# Altium schematic symbol library FPGA_Xilinx_Virtex7.SchLib: 34 symbols (part 19 of 34) (continued)
## XC7VX485T-FFG1927 (continued)
part O pins: AC22 VREFN_0 (io), AC23 VP_0 (io), AD22 VN_0 (io), AD23 VREFP_0 (io), AE10 PROGRAM_B_0 (io), AE11 DONE_0 (io), AE12 VCCO_0 (power), AE22 DXN_0 (io), AE23 DXP_0 (io), AE34 CCLK_0 (io), AF10 M2_0 (io), AF34 TMS_0 (io), AF35 TCK_0 (io), AG10 M1_0 (io), AG11 M0_0 (io), AG12 VCCO_0 (power), AG34 TDO_0 (io), AG35 TDI_0 (io), AK11 CFGBVS_0 (io), AK34 INIT_B_0 (io)
part P pins: A3 GND (power), A4 GND (power), A7 GND (power), A8 GND (power), A11 GND (power), A12 GND (power), A22 GND (power), A32 GND (power), A34 GND (power), A37 GND (power), A38 GND (power), A41 GND (power), A42 GND (power), AA13 VCCINT (power), AA15 VCCINT (power), AA17 VCCINT (power), AA19 VCCAUX_IO_G3 (power), AA21 VCCINT (power), AA23 VCCINT (power), AA25 VCCBRAM (power), AA27 VCCAUX (power), AA29 VCCINT (power), AA31 VCCINT (power), AA33 VCCINT (power), AB12 VCCINT (power), AB14 VCCINT (power), AB16 VCCINT (power), AB18 VCCAUX (power), AB20 VCCINT (power), AB22 GNDADC_0 (power), AB23 VCCADC_0 (power), AB24 VCCBRAM (power), AB26 VCCAUX_IO_G1 (power), AB28 VCCINT (power), AB30 VCCINT (power), AB32 VCCINT (power), AC13 VCCINT (power), AC15 VCCINT (power), AC17 VCCINT (power), AC19 VCCAUX_IO_G3 (power), AC21 VCCINT (power), AC25 VCCBRAM (power), AC27 VCCAUX (power), AC29 VCCINT (power), AC31 VCCINT (power), AC33 VCCINT (power), AD12 VCCINT (power), AD14 VCCINT (power), AD16 VCCINT (power), AD18 VCCAUX (power), AD20 VCCINT (power), AD24 VCCBRAM (power), AD26 VCCAUX_IO_G0 (power), AD28 VCCINT (power), AD30 VCCINT (power), AD32 VCCINT (power), AE13 VCCINT (power), AE15 VCCINT (power), AE17 VCCINT (power), AE19 VCCAUX_IO_G2 (power), AE21 VCCINT (power), AE25 VCCBRAM (power), AE27 VCCAUX (power), AE29 VCCINT (power), AE31 VCCINT (power), AE33 VCCINT (power), AE35 VCCBATT_0 (power), AF12 VCCINT (power), AF14 VCCINT (power), AF16 VCCINT (power), AF18 VCCAUX (power), AF20 VCCINT (power), AF22 VCCINT (power), AF24 VCCBRAM (power), AF26 VCCAUX_IO_G0 (power), AF28 VCCINT (power), AF30 VCCINT (power), AF32 VCCINT (power), AG13 VCCINT (power), AG15 VCCINT (power), AG17 VCCINT (power), AG19 VCCAUX_IO_G2 (power), AG21 VCCINT (power), AG23 VCCINT (power), AG25 VCCBRAM (power), AG27 VCCAUX (power), AG29 VCCINT (power), AG31 VCCINT (power), AG33 VCCINT (power), AH12 VCCINT (power), AH14 VCCINT (power), AH16 VCCINT (power), AH18 VCCAUX (power), AH20 VCCINT (power), AH22 VCCINT (power), AH24 VCCBRAM (power), AH26 VCCAUX_IO_G0 (power), AH28 VCCINT (power), AH30 VCCINT (power), AH32 VCCINT (power), AJ15 VCCINT (power), AJ17 VCCINT (power), AJ19 VCCAUX_IO_G2 (power), AJ27 VCCAUX (power), AJ33 VCCINT (power), B2 GND (power), B6 GND (power), B9 GND (power), B11 GND (power), B19 GND (power), B29 GND (power), B34 GND (power), B36 GND (power), B39 GND (power), B43 GND (power), C4 GND (power), C7 GND (power), C8 GND (power), C11 GND (power), C16 GND (power), C26 GND (power), C34 GND (power), C37 GND (power), C38 GND (power), C41 GND (power), D1 GND (power), D2 GND (power), D6 GND (power), D9 GND (power), D11 GND (power), D13 GND (power), D23 GND (power), D33 GND (power), D34 GND (power), D36 GND (power), D39 GND (power), D43 GND (power), D44 GND (power), E3 GND (power), E4 GND (power), E7 GND (power), E8 GND (power), E11 GND (power), E20 GND (power), E30 GND (power), E34 GND (power), E37 GND (power), E38 GND (power), E41 GND (power), E42 GND (power), F1 GND (power), F2 GND (power), F6 GND (power), F9 GND (power), F11 GND (power), F17 GND (power), F27 GND (power), F34 GND (power), F36 GND (power), F39 GND (power), F43 GND (power), F44 GND (power), G4 GND (power), G7 GND (power), G8 GND (power), G11 GND (power), G14 GND (power), G24 GND (power), G34 GND (power), G37 GND (power), G38 GND (power), G41 GND (power), H1 GND (power), H2 GND (power), H6 GND (power), H9 GND (power), H11 GND (power), H21 GND (power), H31 GND (power), H34 GND (power), H36 GND (power), H39 GND (power), H43 GND (power), H44 GND (power), J3 GND (power), J4 GND (power), J7 GND (power), J8 GND (power), J11 GND (power), J18 GND (power), J28 GND (power), J34 GND (power), V12 VCCINT (power), V14 VCCINT (power), V18 VCCAUX (power), V20 VCCINT (power), V22 VCCINT (power), V24 VCCBRAM (power), V26 VCCAUX_IO_G1 (power), V28 VCCINT (power), V30 VCCINT (power), V32 VCCINT (power), W13 VCCINT (power), W15 VCCINT (power), W17 VCCINT (power), W19 VCCAUX_IO_G3 (power), W21 VCCINT (power), W23 VCCINT (power), W25 VCCBRAM (power), W27 VCCAUX (power), W29 VCCINT (power), W31 VCCINT (power), W33 VCCINT (power), Y12 VCCINT (power), Y14 VCCINT (power), Y16 VCCINT (power), Y18 VCCAUX (power), Y20 VCCINT (power), Y22 VCCINT (power), Y24 VCCBRAM (power), Y26 VCCAUX_IO_G1 (power), Y28 VCCINT (power), Y30 VCCINT (power), Y32 VCCINT (power)
part Q pins: AA3 GND (power), AA4 GND (power), AA7 GND (power), AA11 GND (power), AA12 GND (power), AA14 GND (power), AA16 GND (power), AA18 GND (power), AA20 GND (power), AA22 GND (power), AA24 GND (power), AA26 GND (power), AA28 GND (power), AA30 GND (power), AA32 GND (power), AA34 GND (power), AA38 GND (power), AA41 GND (power), AA42 GND (power), AB1 GND (power), AB2 GND (power), AB6 GND (power), AB9 GND (power), AB10 GND (power), AB11 GND (power), AB13 GND (power), AB15 GND (power), AB17 GND (power), AB19 GND (power), AB21 GND (power), AB25 GND (power), AB27 GND (power), AB29 GND (power), AB31 GND (power), AB33 GND (power), AB34 GND (power), AB35 GND (power), AB36 GND (power), AB39 GND (power), AB43 GND (power), AB44 GND (power), AC4 GND (power), AC8 GND (power), AC11 GND (power), AC12 GND (power), AC14 GND (power), AC16 GND (power), AC18 GND (power), AC20 GND (power), AC24 GND (power), AC26 GND (power), AC28 GND (power), AC30 GND (power), AC32 GND (power), AC34 GND (power), AC37 GND (power), AC41 GND (power), AD1 GND (power), AD2 GND (power), AD6 GND (power), AD9 GND (power), AD10 GND (power), AD11 GND (power), AD13 GND (power), AD15 GND (power), AD17 GND (power), AD19 GND (power), AD21 GND (power), AD25 GND (power), AD27 GND (power), AD29 GND (power), AD31 GND (power), AD33 GND (power), AD34 GND (power), AD35 GND (power), AD36 GND (power), AD39 GND (power), AD43 GND (power), AD44 GND (power), AE3 GND (power), AE4 GND (power), AE7 GND (power), AE9 GND (power), AE14 GND (power), AE16 GND (power), AE18 GND (power), AE20 GND (power), AE24 GND (power), AE26 GND (power), AE28 GND (power), AE30 GND (power), AE32 GND (power), AE36 GND (power), AE38 GND (power), AE41 GND (power), AE42 GND (power), AF1 GND (power), AF2 GND (power), AF6 GND (power), AF9 GND (power), AF11 GND (power), AF13 GND (power), AF15 GND (power), AF17 GND (power), AF19 GND (power), AF21 GND (power), AF23 GND (power), AF25 GND (power), AF27 GND (power), AF29 GND (power), AF31 GND (power), AF33 GND (power), AF36 GND (power), AF39 GND (power), AF43 GND (power), AF44 GND (power), AG4 GND (power), AG7 GND (power), AG9 GND (power), AG14 GND (power), AG16 GND (power), AG18 GND (power), AG20 GND (power), AG22 GND (power), AG24 GND (power), AG26 GND (power), AG28 GND (power), AG30 GND (power), AG32 GND (power), AG36 GND (power), AG38 GND (power), AG41 GND (power), AH1 GND (power), AH2 GND (power), AH6 GND (power), AH9 GND (power), AH10 GND (power), AH11 GND (power), AH13 GND (power), AH15 GND (power), AH17 GND (power), AH19 GND (power), AH21 GND (power), AH23 GND (power), AH25 GND (power), AH27 GND (power), AH29 GND (power), AH31 GND (power), AH33 GND (power), AH34 GND (power), J37 GND (power), J38 GND (power), J41 GND (power), J42 GND (power), K1 GND (power), K2 GND (power), K6 GND (power), K9 GND (power), K11 GND (power), K15 GND (power), K25 GND (power), K34 GND (power), K36 GND (power), K39 GND (power), K43 GND (power), K44 GND (power), L4 GND (power), L7 GND (power), L8 GND (power), L11 GND (power), L12 GND (power), L22 GND (power), L32 GND (power), L34 GND (power), L37 GND (power), L38 GND (power), L41 GND (power), M1 GND (power), M2 GND (power), M6 GND (power), M9 GND (power), M11 GND (power), M19 GND (power), M29 GND (power), M34 GND (power), M36 GND (power), M39 GND (power), M43 GND (power), M44 GND (power), N3 GND (power), N4 GND (power), N7 GND (power), N8 GND (power), N11 GND (power), N16 GND (power), N26 GND (power), N34 GND (power), N37 GND (power), N38 GND (power), N41 GND (power), N42 GND (power), P1 GND (power), P2 GND (power), P6 GND (power), P9 GND (power), P11 GND (power), P13 GND (power), P23 GND (power), P33 GND (power), P34 GND (power), P36 GND (power), P39 GND (power), P43 GND (power), P44 GND (power), R4 GND (power), R7 GND (power), R11 GND (power), R20 GND (power), R30 GND (power), R34 GND (power), R38 GND (power), R41 GND (power), T1 GND (power), T2 GND (power), T6 GND (power), T9 GND (power), T11 GND (power), T17 GND (power), T27 GND (power), T34 GND (power), T36 GND (power), T39 GND (power), T43 GND (power), T44 GND (power), U3 GND (power), U4 GND (power), U7 GND (power), U11 GND (power), U14 GND (power), U24 GND (power), U34 GND (power), U38 GND (power), U41 GND (power), U42 GND (power), V1 GND (power), V2 GND (power), V6 GND (power), V9 GND (power), V11 GND (power), V13 GND (power), V17 GND (power), V19 GND (power), V21 GND (power), V23 GND (power), V25 GND (power), V27 GND (power), V29 GND (power), V31 GND (power), V33 GND (power), V34 GND (power), V36 GND (power), V39 GND (power), V43 GND (power), V44 GND (power), W4 GND (power), W7 GND (power), W11 GND (power), W12 GND (power), W14 GND (power), W16 GND (power), W18 GND (power), W20 GND (power), W22 GND (power), W24 GND (power), W26 GND (power), W28 GND (power), W30 GND (power), W32 GND (power), W34 GND (power), W38 GND (power), W41 GND (power), Y1 GND (power), Y2 GND (power), Y6 GND (power), Y9 GND (power), Y11 GND (power), Y13 GND (power), Y15 GND (power), Y17 GND (power), Y19 GND (power), Y21 GND (power), Y23 GND (power), Y25 GND (power), Y27 GND (power), Y29 GND (power), Y31 GND (power), Y33 GND (power), Y34 GND (power), Y36 GND (power), Y39 GND (power), Y43 GND (power), Y44 GND (power)
part R pins: AH35 GND (power), AH36 GND (power), AH39 GND (power), AH43 GND (power), AH44 GND (power), AJ4 GND (power), AJ8 GND (power), AJ11 GND (power), AJ12 GND (power), AJ18 GND (power), AJ20 GND (power), AJ24 GND (power), AJ28 GND (power), AJ34 GND (power), AJ37 GND (power), AJ41 GND (power), AK1 GND (power), AK2 GND (power), AK5 GND (power), AK6 GND (power), AK9 GND (power), AK10 GND (power), AK15 GND (power), AK25 GND (power), AK35 GND (power), AK36 GND (power), AK39 GND (power), AK40 GND (power), AK43 GND (power), AK44 GND (power), AL4 GND (power), AL7 GND (power), AL11 GND (power), AL12 GND (power), AL22 GND (power), AL32 GND (power), AL34 GND (power), AL38 GND (power), AL41 GND (power), AM1 GND (power), AM2 GND (power), AM6 GND (power), AM9 GND (power), AM11 GND (power), AM19 GND (power), AM29 GND (power), AM34 GND (power), AM36 GND (power), AM39 GND (power), AM43 GND (power), AM44 GND (power), AN3 GND (power), AN4 GND (power), AN7 GND (power), AN11 GND (power), AN16 GND (power), AN26 GND (power), AN34 GND (power), AN38 GND (power), AN41 GND (power), AN42 GND (power), AP1 GND (power), AP2 GND (power), AP6 GND (power), AP9 GND (power), AP11 GND (power), AP13 GND (power), AP23 GND (power), AP33 GND (power), AP34 GND (power), AP36 GND (power), AP39 GND (power), AP43 GND (power), AP44 GND (power), AR4 GND (power), AR7 GND (power), AR11 GND (power), AR20 GND (power), AR30 GND (power), AR34 GND (power), AR38 GND (power), AR41 GND (power), AT1 GND (power), AT2 GND (power), AT6 GND (power), AT9 GND (power), AT10 GND (power), AT11 GND (power), AT17 GND (power), AT27 GND (power), AT34 GND (power), AT35 GND (power), AT36 GND (power), AT39 GND (power), AT43 GND (power), AT44 GND (power), AU3 GND (power), AU4 GND (power), AU7 GND (power), AU9 GND (power), AU14 GND (power), AU24 GND (power), AU34 GND (power), AU36 GND (power), AU38 GND (power), AU41 GND (power), AU42 GND (power), AV1 GND (power), AV2 GND (power), AV6 GND (power), AV9 GND (power), AV11 GND (power), AV21 GND (power), AV31 GND (power), AV36 GND (power), AV39 GND (power), AV43 GND (power), AV44 GND (power), AW4 GND (power), AW7 GND (power), AW9 GND (power), AW18 GND (power), AW28 GND (power), AW36 GND (power), AW38 GND (power), AW41 GND (power), AY1 GND (power), AY2 GND (power), AY6 GND (power), AY9 GND (power), AY15 GND (power), AY25 GND (power), AY35 GND (power), AY36 GND (power), AY39 GND (power), AY43 GND (power), AY44 GND (power), BA3 GND (power), BA4 GND (power), BA7 GND (power), BA9 GND (power), BA12 GND (power), BA22 GND (power), BA32 GND (power), BA36 GND (power), BA38 GND (power), BA41 GND (power), BA42 GND (power), BB1 GND (power), BB2 GND (power), BB6 GND (power), BB9 GND (power), BB19 GND (power), BB29 GND (power), BB36 GND (power), BB39 GND (power), BB43 GND (power), BB44 GND (power), BC2 GND (power), BC4 GND (power), BC7 GND (power), BC9 GND (power), BC16 GND (power), BC26 GND (power), BC36 GND (power), BC38 GND (power), BC41 GND (power), BC43 GND (power), BD5 GND (power), BD6 GND (power), BD9 GND (power), BD13 GND (power), BD23 GND (power), BD33 GND (power), BD36 GND (power), BD39 GND (power), BD40 GND (power)

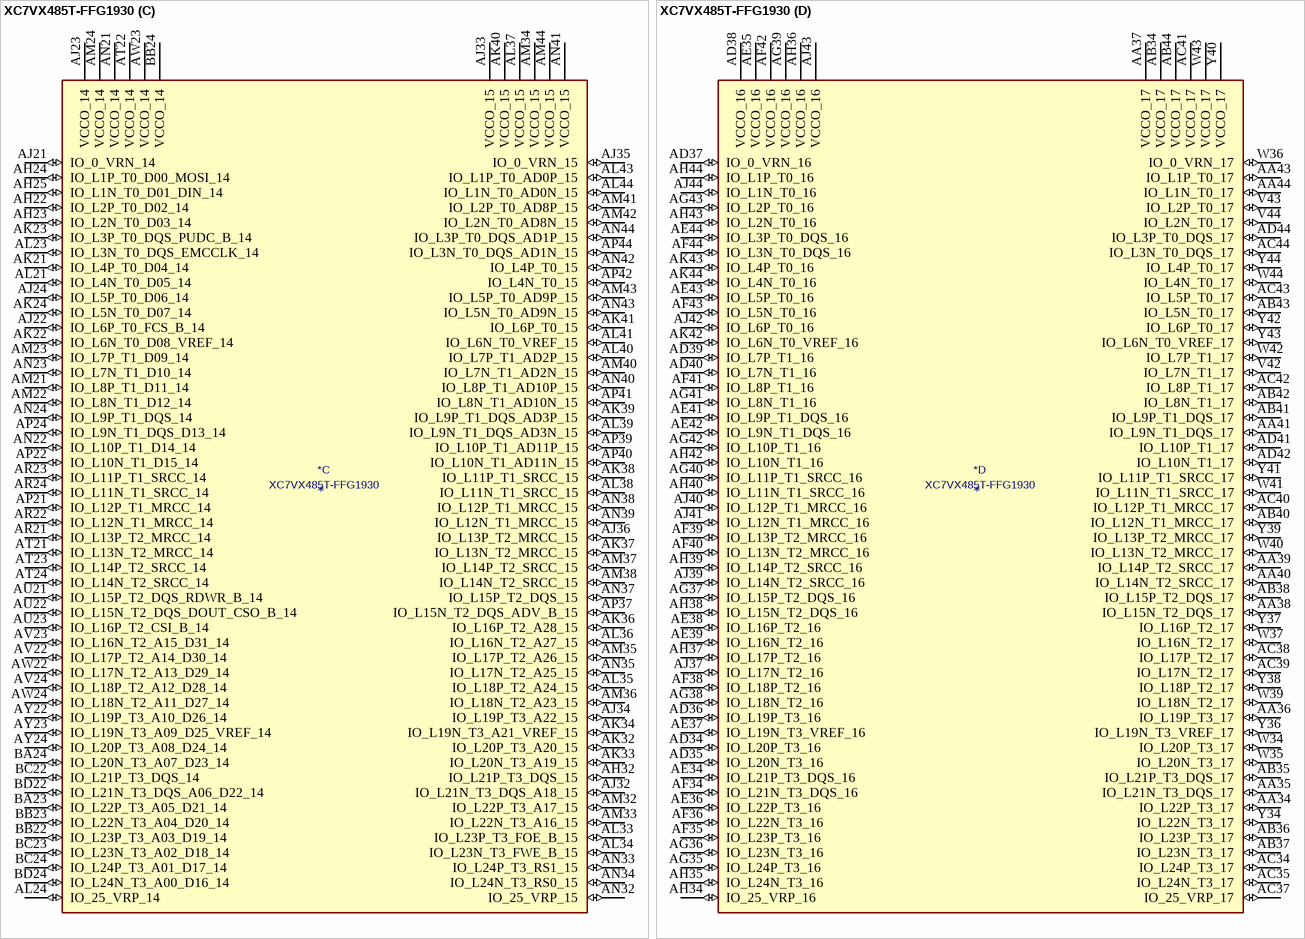
[diagram p92: symbol XC7VX485T-FFG1930]

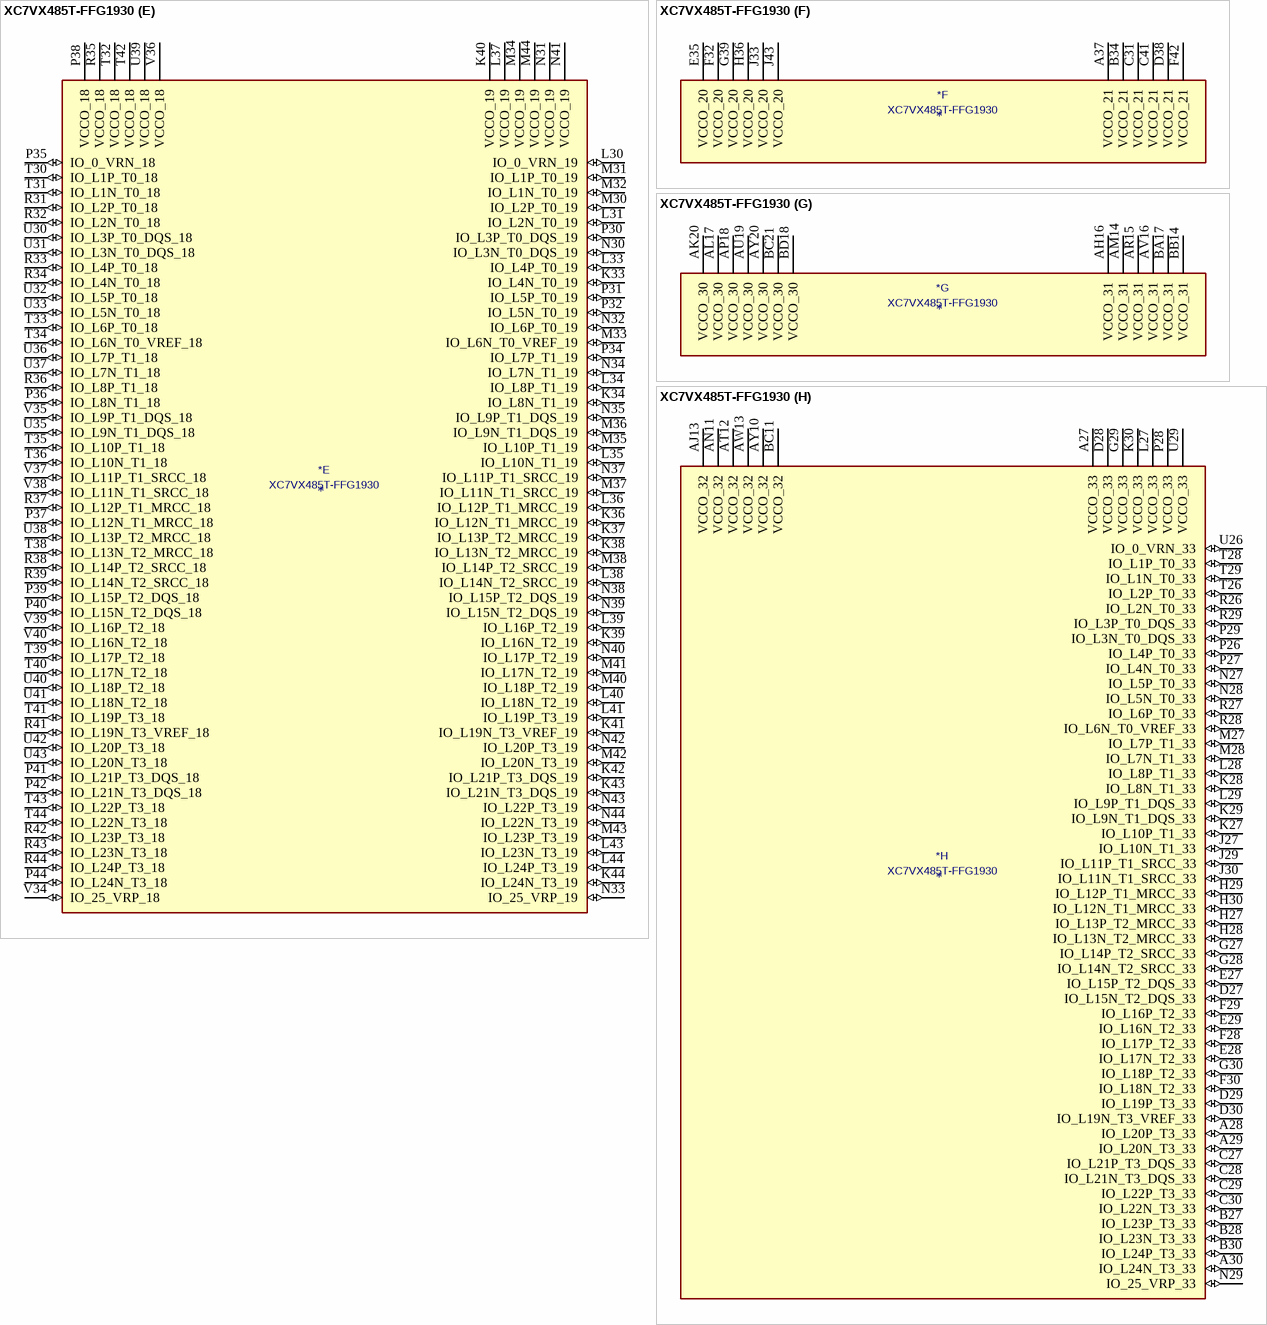
[diagram p93: symbol XC7VX485T-FFG1930]

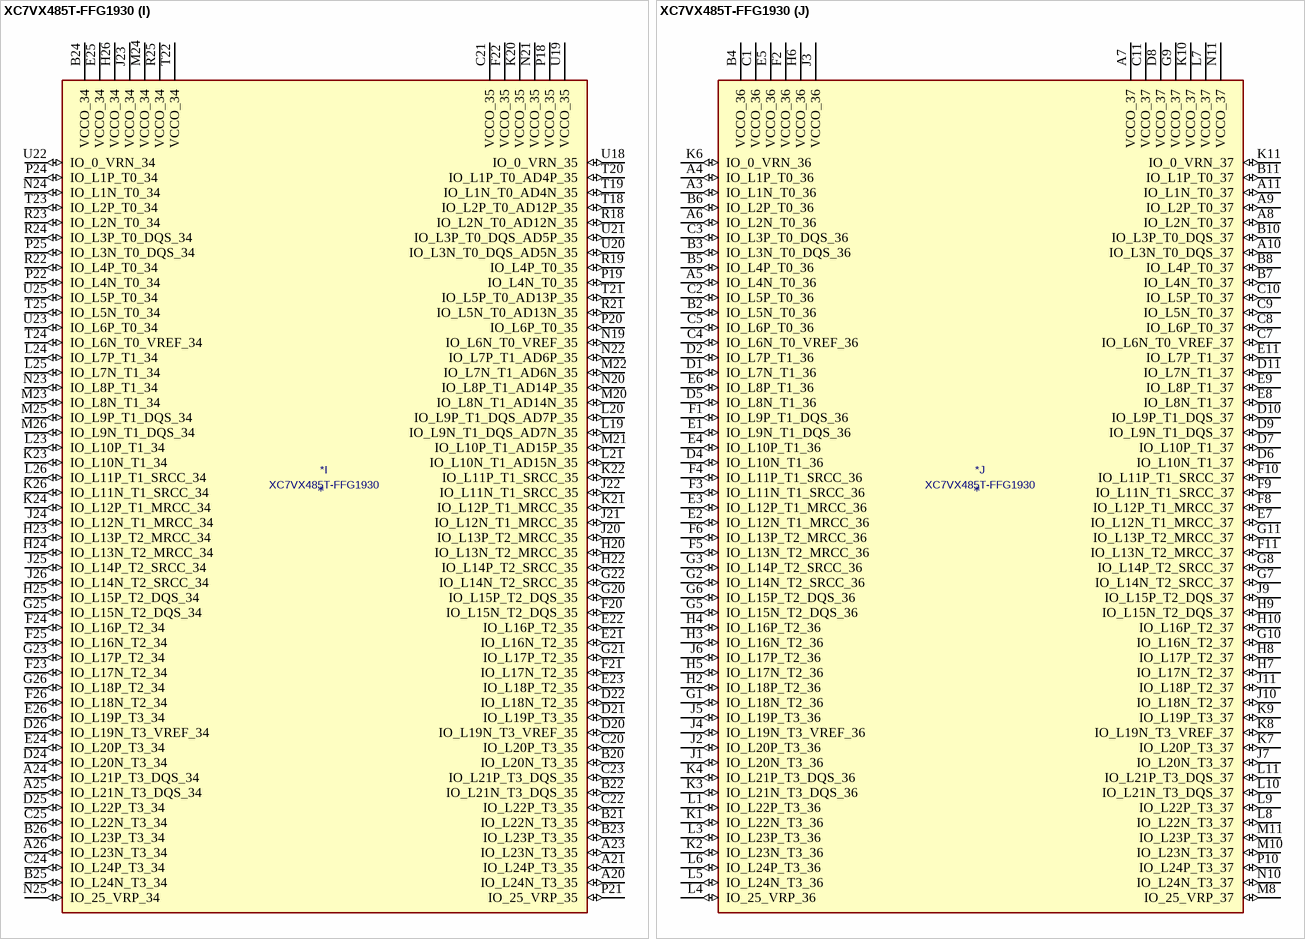
[diagram p94: symbol XC7VX485T-FFG1930]

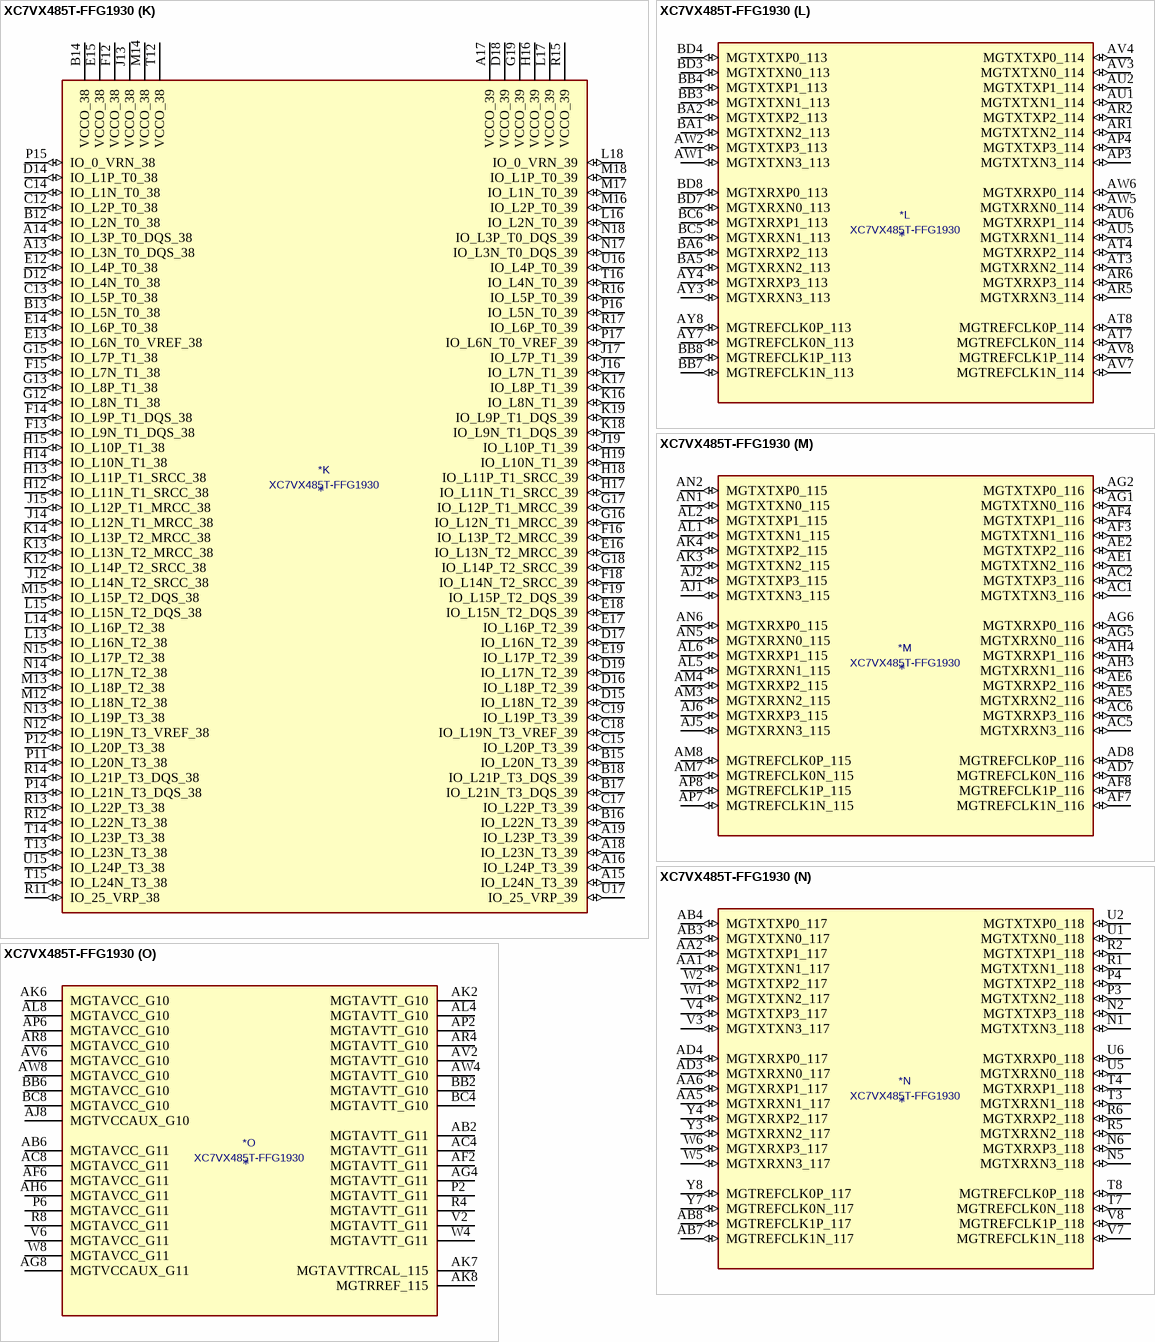
[diagram p95: symbol XC7VX485T-FFG1930]

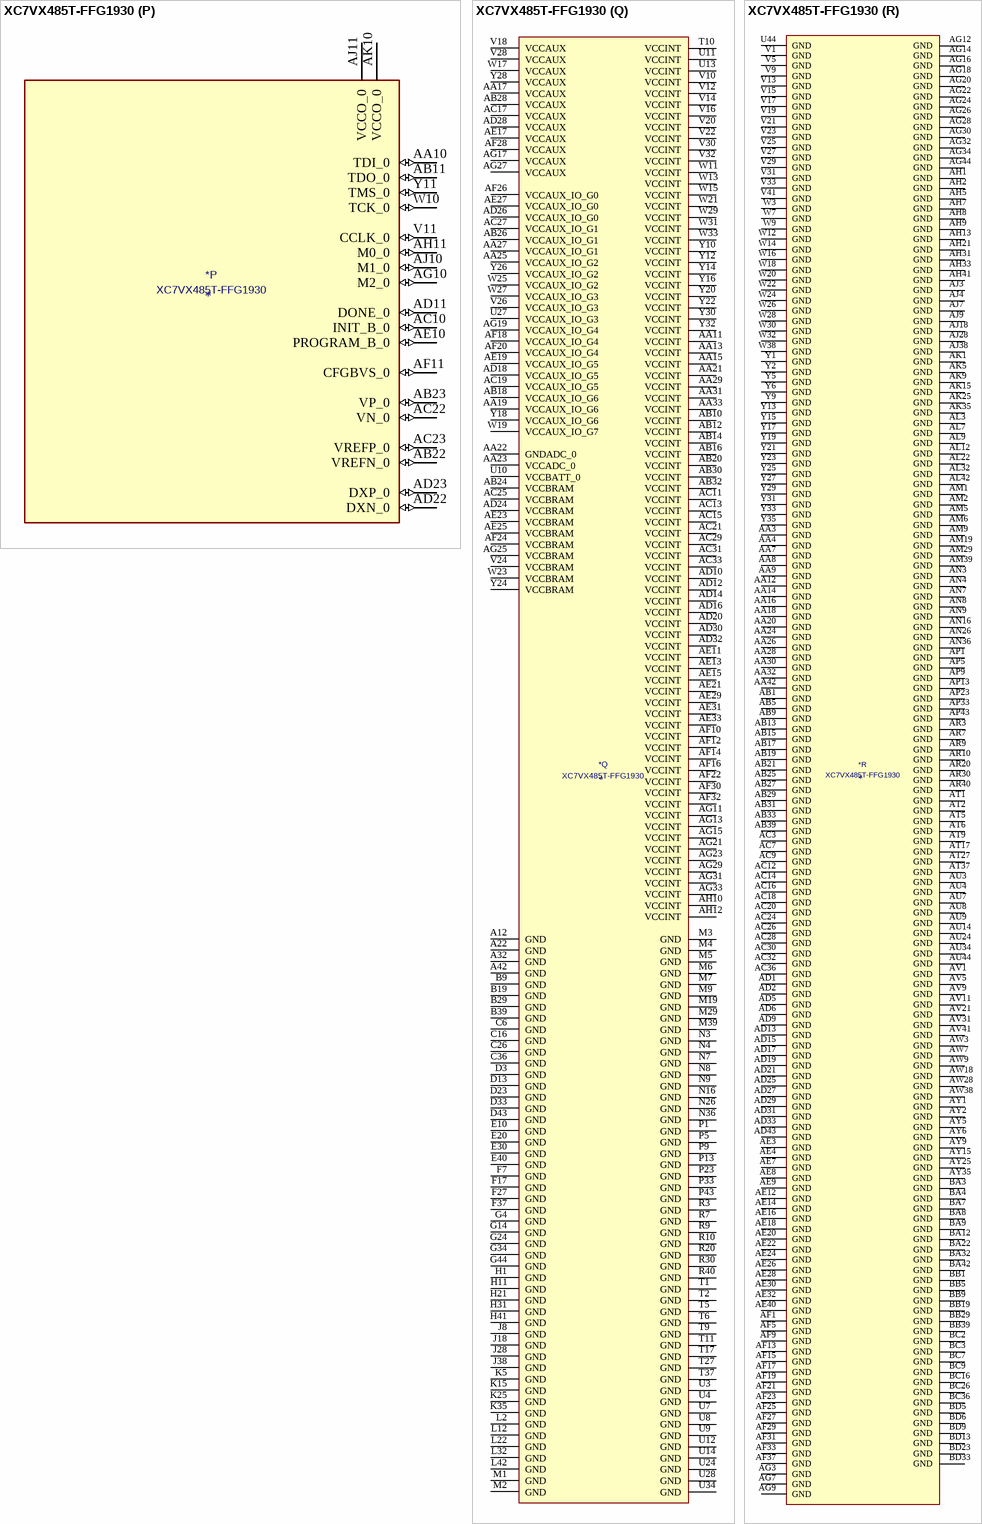
[diagram p96: symbol XC7VX485T-FFG1930]